# Altium footprint library 封装库.PcbLib: 755 footprints (part 43 of 48)
Each footprint in its own frame and in the unit in brackets; x right, y up, seen from the top. Pads: shape width x height; smd on the part's side, far side on the other; paste and mask are expansions set on the pad; w line width, h text height; cw(c..) or ccw(c..) is an arc to the next point about the centre after c.
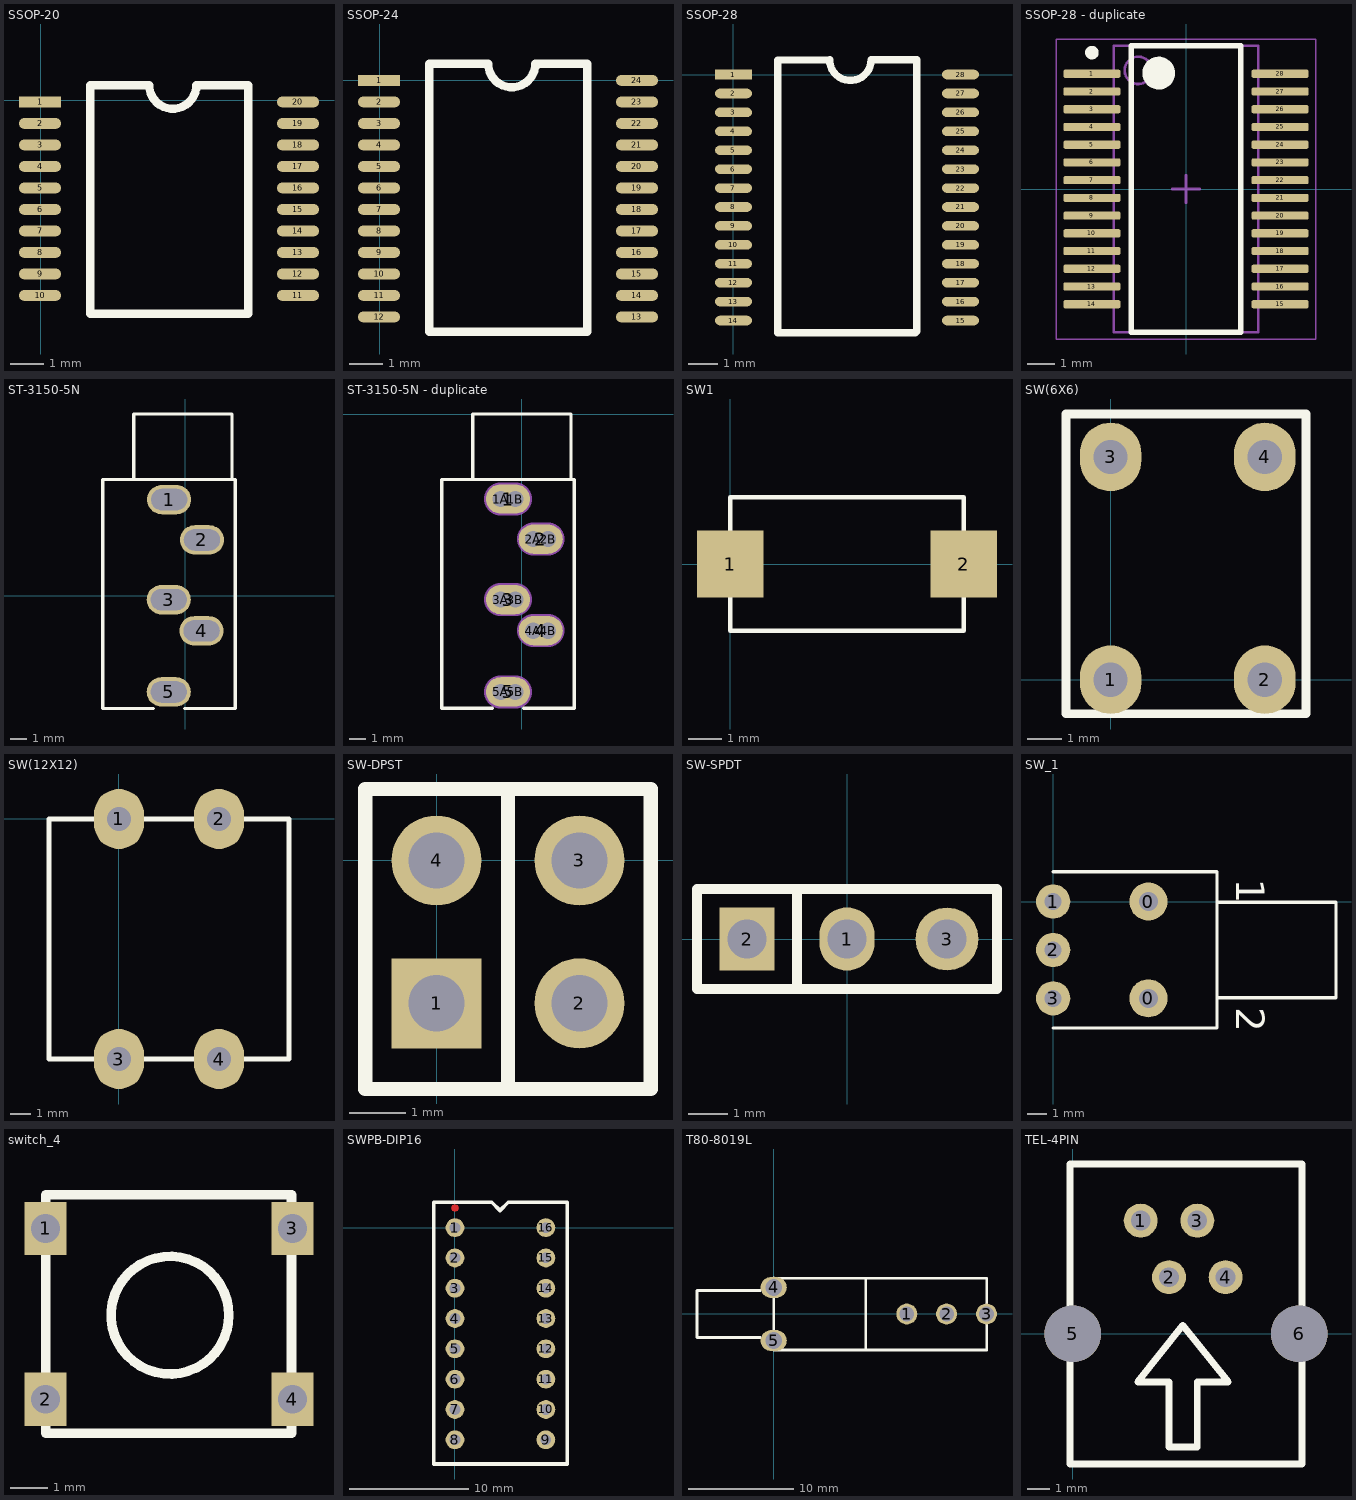
[diagram p42: the footprints below, top view; thin cyan lines are the x and y axes]

## SSOP-20 [mm]
pads (20):
  rect 1.27x0.33 smd: 1(-0.025,-0.051)
  oval 1.27x0.33 smd: 2(-0.025,-0.701) 3(-0.025,-1.351) 4(-0.025,-2.001) 5(-0.025,-2.651) 6(-0.025,-3.301) 7(-0.025,-3.951) 8(-0.025,-4.601) 9(-0.025,-5.251) 10(-0.025,-5.901) 11(7.775,-5.901) 12(7.775,-5.251) 13(7.775,-4.601) 14(7.775,-3.951) 15(7.775,-3.301) 16(7.775,-2.651) 17(7.775,-2.001) 18(7.775,-1.351) 19(7.775,-0.701) 20(7.775,-0.051)
Top Overlay:
  lines w0.254: 6.223,-6.45 1.499,-6.45 1.499,0.449 3.269,0.449 3.277,0.457 ccw(c3.99,0.457) 4.703,0.457 6.266,0.457 6.274,0.449 6.274,-6.45

## SSOP-24 [mm]
pads (24):
  rect 1.27x0.33 smd: 1(-0.025,0)
  oval 1.27x0.33 smd: 2(-0.025,-0.65) 3(-0.025,-1.3) 4(-0.025,-1.95) 5(-0.025,-2.6) 6(-0.025,-3.25) 7(-0.025,-3.9) 8(-0.025,-4.55) 9(-0.025,-5.2) 10(-0.025,-5.85) 11(-0.025,-6.5) 12(-0.025,-7.15) 13(7.775,-7.15) 14(7.775,-6.5) 15(7.775,-5.85) 16(7.775,-5.2) 17(7.775,-4.55) 18(7.775,-3.9) 19(7.775,-3.25) 20(7.775,-2.6) 21(7.775,-1.95) 22(7.775,-1.3) 23(7.775,-0.65) 24(7.775,0)
Top Overlay:
  lines w0.254: 6.223,-7.6 1.499,-7.6 1.499,0.5 3.269,0.5 3.277,0.508 ccw(c3.99,0.508) 4.703,0.508 6.266,0.508 6.274,0.5 6.274,-7.6

## SSOP-28 [mm]
pads (28):
  rect 1.27x0.33 smd: 1(0,0)
  oval 1.27x0.33 smd: 2(0,-0.65) 3(0,-1.3) 4(0,-1.95) 5(0,-2.6) 6(0,-3.25) 7(0,-3.9) 8(0,-4.55) 9(0,-5.2) 10(0,-5.85) 11(0,-6.5) 12(0,-7.15) 13(0,-7.8) 14(0,-8.45) 15(7.8,-8.45) 16(7.8,-7.8) 17(7.8,-7.15) 18(7.8,-6.5) 19(7.8,-5.85) 20(7.8,-5.2) 21(7.8,-4.55) 22(7.8,-3.9) 23(7.8,-3.25) 24(7.8,-2.6) 25(7.8,-1.95) 26(7.8,-1.3) 27(7.8,-0.65) 28(7.8,0)
Top Overlay:
  lines w0.254: 1.524,-8.865 1.524,0.5 3.294,0.5 3.302,0.508 ccw(c4.015,0.508) 4.728,0.508 6.291,0.508 6.299,0.5 6.299,-8.814 6.248,-8.865 1.524,-8.865

## SSOP-28 - duplicate [mm] "SOP, 28-Leads, Body 10.20x5.15mm, Pitch 0.65mm, IPC Medium Density"
height 2
pads (28):
  rrect50% 2.1x0.3 smd: 1(-3.45,4.225) 2(-3.45,3.575) 3(-3.45,2.925) 4(-3.45,2.275) 5(-3.45,1.625) 6(-3.45,0.975) 7(-3.45,0.325) 8(-3.45,-0.325) 9(-3.45,-0.975) 10(-3.45,-1.625) 11(-3.45,-2.275) 12(-3.45,-2.925) 13(-3.45,-3.575) 14(-3.45,-4.225) 15(3.45,-4.225) 16(3.45,-3.575) 17(3.45,-2.925) 18(3.45,-2.275) 19(3.45,-1.625) 20(3.45,-0.975) 21(3.45,-0.325) 22(3.45,0.325) 23(3.45,0.975) 24(3.45,1.625) 25(3.45,2.275) 26(3.45,2.925) 27(3.45,3.575) 28(3.45,4.225)
Top Overlay:
  circle w0.25: c-3.45,5 r0.125
  circle w0.6: c-1,4.25 r0.3
  lines w0.2: -2,-5.25 -2,5.25 2,5.25 2,-5.25 -2,-5.25
Mechanical 13:
  circle w0.1: c-1.75,4.35 r0.5
  lines w0.1: -2.65,-5.25 -2.65,5.25 2.65,5.25 2.65,-5.25 -2.65,-5.25
Mechanical 15:
  lines w0.05: -4.75,-5.5 -4.75,5.5 4.75,5.5 4.75,-5.5 -4.75,-5.5
  lines w0.1: -0.5,0 0.5,0 ; 0,-0.5 0,0.5
3D body: height 2, standoff 0.05, extent -2.65,-5.25 2.65,5.25

## ST-3150-5N [mm] "Connector; Stereo Jack, 3.5mm, 5 Position"
pads (5):
  oval 2.7x1.8 hole 1.3 slot 2.2 at 0 deg: 1(-0.991,5.867) 2(1.016,3.404) 3(-1.016,-0.254) 4(0.991,-2.159) 5(-1.016,-5.893)
Top Overlay:
  lines w0.2: -3.15,7.1 -3.15,11.1 2.85,11.1 2.85,7.1 ; -1.95,-6.9 -5.05,-6.9 -5.05,7.1 3.05,7.1 3.05,-6.9 -0.05,-6.9

## ST-3150-5N - duplicate [mm] "Connector; Stereo Jack, 3.5mm, 5 Position"
height 1.7
pads (15):
  oval 2.7x1.8 all layers, no hole: 1(-0.85,-5.2) 2(1.15,-7.65) 3(-0.85,-11.35) 4(1.15,-13.25) 5(-0.85,-17)
  round 1.2 hole 1: 1A(-1.3,-5.2) 1B(-0.4,-5.2) 2A(0.7,-7.65) 2B(1.6,-7.65) 3A(-1.3,-11.35) 3B(-0.4,-11.35) 4A(0.7,-13.25) 4B(1.6,-13.25) 5A(-1.3,-17) 5B(-0.4,-17)
Top Overlay:
  lines w0.2: -3,-4 -3,0 3,0 3,-4 ; -1.8,-18 -4.9,-18 -4.9,-4 3.2,-4 3.2,-18 0.1,-18
Mechanical 1:
  lines w1: -1.3,-17 -0.4,-17 ; -1.3,-11.35 -0.4,-11.35 ; -1.3,-5.2 -0.4,-5.2 ; 0.7,-13.25 1.6,-13.25 ; 0.7,-7.65 1.6,-7.65
Mechanical 2:
  lines w2.016: -1.3,-17 -0.4,-17 ; -1.3,-11.35 -0.4,-11.35 ; -1.3,-5.2 -0.4,-5.2 ; 0.7,-13.25 1.6,-13.25 ; 0.7,-7.65 1.6,-7.65

## SW1 [mm]
pads (2):
  rect 2x2 smd: 1(0,0) 2(7,0)
Top Overlay:
  lines w0.127: 0,-2 0,2 7,2 7,-2 0,-2

## SW(6X6) [mm]
pads (4):
  oval 1.8x2 hole 1: 1(0,0) 2(4.5,0) 3(0,6.5) 4(4.5,6.5)
Top Overlay:
  lines w0.254: -1.3,-0.996 5.7,-0.996 5.7,7.754 -1.3,7.754 -1.3,-0.996

## SW(12X12) [mm]
pads (4):
  oval 2.5x3 hole 1.2: 1(0,0) 2(5,0) 3(0,-12) 4(5,-12)
Top Overlay:
  lines w0.25: -3.5,-12 -3.5,0 8.5,0 8.5,-12 -3.5,-12

## SW-DPST [mm]
pads (4):
  rect 1.6x1.6 hole 1: 1(0,-2.54)
  round 1.6 hole 1: 2(2.54,-2.54) 3(2.54,0) 4(0,0)
Top Overlay:
  lines w0.254: 1.27,-4.064 1.27,1.27 ; -1.27,-4.064 -1.27,1.27 3.81,1.27 3.81,-4.064 -1.27,-4.064

## SW-SPDT [mm]
pads (3):
  oval 1.4x1.6 hole 1: 1(0,0)
  rect 1.4x1.6 hole 1: 2(-2.54,0)
  round 1.6 hole 1: 3(2.54,0)
Top Overlay:
  lines w0.254: -1.27,-1.27 -1.27,1.27 ; -3.81,-1.27 3.81,-1.27 3.81,1.27 -3.81,1.27 -3.81,-1.27

## SW_1 [mm]
pads (5):
  round 2 hole 1: 0(4.992,-5.08) 0(4.992,0)
  round 1.8 hole 0.9: 1(-0.008,0) 2(-0.008,-2.54) 3(-0.008,-5.08)
Top Overlay:
  lines w0.178: -0.008,-6.64 8.592,-6.64 8.592,1.56 -0.008,1.56 ; 8.592,-5.04 14.842,-5.04 14.842,-0.04 8.592,-0.04
  text "1" at 9.592,1.21 h1.5
  text "2" at 9.592,-5.54 h1.5

## switch_4 [mm]
pads (4):
  rect 1.1x1.4 hole 0.762: 1(-741.045,-772.922) 2(-741.045,-777.422) 3(-734.545,-772.922) 4(-734.545,-777.422)
Top Overlay:
  circle w0.254: c-737.769,-775.208 r1.55
  lines w0.254: -741.045,-778.32 -734.568,-778.32 -734.568,-772.033 -741.045,-772.033 -741.045,-778.32

## SWPB-DIP16 [mil]
pads (16):
  round 62 hole 35: 1(0,0) 2(0,-100) 3(0,-200) 4(0,-300) 5(0,-400) 6(0,-500) 7(0,-600) 8(0,-700) 9(300,-700) 10(300,-600) 11(300,-500) 12(300,-400) 13(300,-300) 14(300,-200) 15(300,-100) 16(300,0)
Top Layer:
  region: 12.28,65 11.34,69.7 8.68,73.68 4.7,76.34 0,77.28 -4.7,76.34 -8.68,73.68 -11.34,69.7 -12.28,65 -11.34,60.3 -8.68,56.32 -4.7,53.66 0,52.72 4.7,53.66 8.68,56.32 11.34,60.3
Top Overlay:
  lines w12: -70,-780 370,-780 370,84.06 176.06,84.06 148.56,56.56 121.06,84.06 -70,84.06 -70,-780
Bottom Paste:
  lines w7.87: 220,-215 220,185 295,185 ccw(c320,185) 345,185 420,185 420,-215 220,-215
Multi-Layer:
  text "Comment" at -33.5,61.94 h25

## T80-8019L [mm]
pads (5):
  round 2 hole 1.4: 1(12.69,-0.002) 2(16.49,-0.002) 3(20.3,-0.002)
  oval 2.5x2 hole 1.6: 4(-0.01,2.538) 5(-0.01,-2.542)
Top Overlay:
  lines w0.254: -1.285,-2.252 -7.33,-2.252 -7.33,2.248 -1.285,2.248 ; -0.01,3.423 20.315,3.423 20.315,-2.542 20.315,-3.427 20.31,-3.432 -0.01,-3.432 -0.01,3.428 ; 8.79,-3.432 8.79,3.423

## TEL-4PIN [mil]
pads (6):
  round 60 hole 35: 1(120,200) 2(170,100) 3(220,200) 4(270,100)
  round 100 hole 100: 5(0,0) 6(400,0)
Top Overlay:
  lines w12: -5,-230 405,-230 405,300 -5,300 -5,-230 ; 115,-85 170,-85 170,-200 220,-200 220,-85 274.39,-85 194.39,15 115,-85